# Altium schematic symbol library Linear Technology Power Management LDO Linear Regulators.SchLib: 2339 symbols (part 14 of 97) (continued)
## LT1521IST-3.3
designator U?
300 mA Low Dropout Regulator with Micropower Quiescent Current and Shutdown, 4.3 to 20 V Vin, 3.3 V Vout, 3-pin SOT223 (ST-3), -40 to 125 degC; Manufacturer: Linear Technology; PartNumber: LT1521IST-3.3; Discrete Pass Element: no; Dropout Voltage(V): 0.5; Iout(mA): 300; Isupply(mA): 0.012; Number of Outputs: 1; Output Voltage: 3.3 V; Shutdown Current(uA): 6; Vin Max(V): 20; Vin Min(V): 4.3; DatasheetVersion: Rev. B; PackageVersion: Jun-10; PackageReference: ST-3; PackageDescription: 3-Pin Plastic SOT-223, 3.505 x 6.505 mm Body, Pitch 2.3 mm; Supplier 1: Digi-Key; Supplier Part Number 1: LT1521IST-3.3-ND; Supplier 2: Newark; Supplier Part Number 2: 57M4776; RoHS: FALSE; Mounting Technology: Surface Mount; ComponentLink1Description: Manufacturer URL; ComponentLink1URL: http://www.linear.com/; ComponentLink2Description: Datasheet; ComponentLink2URL: http://cds.linear.com/docs/en/datasheet/1521335fb.pdf; ComponentLink3Description: Package Specification; ComponentLink3URL: http://cds.linear.com/docs/en/packaging/SOT_3_05-08-1630.pdf
footprint LT-ST-3-SOT-223_N (SOT223, 4-Leads, Body 6.505x3.505mm, Pitch 2.3mm, IPC Medium Density)
footprint LT-ST-3-SOT-223_L (SOT223, 4-Leads, Body 6.505x3.505mm, Pitch 2.3mm, IPC High Density)
footprint LT-ST-3-SOT-223_M (SOT223, 4-Leads, Body 6.505x3.505mm, Pitch 2.3mm, IPC Low Density)
pins: 1 IN (power) "Power is supplied to the device through the IN pin. A bypass capacitor is required on this pin if the device is more than six inches away from the main input filter capacitor. In general, the output impedance of a battery (See Datasheet)", 2 GND (power), 3 OUT (power) "The output supplies power to the load. A minimum output capacitor of 10uF is required to prevent oscillations. Larger output capacitors will be required for applications with large transient loads to limit peak voltage (See Datasheet)", 4 TAB (power)

## LT1521IST-3.3#PBF
designator U?
300 mA Low Dropout Regulator with Micropower Quiescent Current and Shutdown, 4.3 to 20 V Vin, 3.3 V Vout, 3-pin SOT223 (ST-3), -40 to 125 degC, Pb-Free; Manufacturer: Linear Technology; PartNumber: LT1521IST-3.3#PBF; Discrete Pass Element: no; Dropout Voltage(V): 0.5; Iout(mA): 300; Isupply(mA): 0.012; Number of Outputs: 1; Output Voltage: 3.3 V; Shutdown Current(uA): 6; Vin Max(V): 20; Vin Min(V): 4.3; DatasheetVersion: Rev. B; PackageVersion: Jun-10; PackageReference: ST-3; PackageDescription: 3-Pin Plastic SOT-223, 3.505 x 6.505 mm Body, Pitch 2.3 mm; Supplier 1: Digi-Key; Supplier Part Number 1: LT1521IST-3.3#PBF-ND; Supplier 2: Farnell; Supplier Part Number 2: 1663449; Supplier 3: Newark; Supplier Part Number 3: 57M4777; RoHS: TRUE; Mounting Technology: Surface Mount; ComponentLink1Description: Manufacturer URL; ComponentLink1URL: http://www.linear.com/; ComponentLink2Description: Datasheet; ComponentLink2URL: http://cds.linear.com/docs/en/datasheet/1521335fb.pdf; ComponentLink3Description: Package Specification; ComponentLink3URL: http://cds.linear.com/docs/en/packaging/SOT_3_05-08-1630.pdf
footprint LT-ST-3-SOT-223_N (SOT223, 4-Leads, Body 6.505x3.505mm, Pitch 2.3mm, IPC Medium Density)
footprint LT-ST-3-SOT-223_L (SOT223, 4-Leads, Body 6.505x3.505mm, Pitch 2.3mm, IPC High Density)
footprint LT-ST-3-SOT-223_M (SOT223, 4-Leads, Body 6.505x3.505mm, Pitch 2.3mm, IPC Low Density)
pins: 1 IN (power) "Power is supplied to the device through the IN pin. A bypass capacitor is required on this pin if the device is more than six inches away from the main input filter capacitor. In general, the output impedance of a battery (See Datasheet)", 2 GND (power), 3 OUT (power) "The output supplies power to the load. A minimum output capacitor of 10uF is required to prevent oscillations. Larger output capacitors will be required for applications with large transient loads to limit peak voltage (See Datasheet)", 4 TAB (power)

## LT1521IST-3.3#TR
designator U?
300 mA Low Dropout Regulator with Micropower Quiescent Current and Shutdown, 4.3 to 20 V Vin, 3.3 V Vout, 3-pin SOT223 (ST-3), -40 to 125 degC, Tape and Reel; Manufacturer: Linear Technology; PartNumber: LT1521IST-3.3#TR; Discrete Pass Element: no; Dropout Voltage(V): 0.5; Iout(mA): 300; Isupply(mA): 0.012; Number of Outputs: 1; Output Voltage: 3.3 V; Shutdown Current(uA): 6; Vin Max(V): 20; Vin Min(V): 4.3; DatasheetVersion: Rev. B; PackageVersion: Jun-10; PackageReference: ST-3; PackageDescription: 3-Pin Plastic SOT-223, 3.505 x 6.505 mm Body, Pitch 2.3 mm; Supplier 1: Digi-Key; Supplier Part Number 1: LT1521IST-3.3#TR-ND; Supplier 2: Newark; Supplier Part Number 2: 57M4778; Packing: Tape and Reel; RoHS: FALSE; Mounting Technology: Surface Mount; ComponentLink1Description: Manufacturer URL; ComponentLink1URL: http://www.linear.com/; ComponentLink2Description: Datasheet; ComponentLink2URL: http://cds.linear.com/docs/en/datasheet/1521335fb.pdf; ComponentLink3Description: Package Specification; ComponentLink3URL: http://cds.linear.com/docs/en/packaging/SOT_3_05-08-1630.pdf
footprint LT-ST-3-SOT-223_N (SOT223, 4-Leads, Body 6.505x3.505mm, Pitch 2.3mm, IPC Medium Density)
footprint LT-ST-3-SOT-223_L (SOT223, 4-Leads, Body 6.505x3.505mm, Pitch 2.3mm, IPC High Density)
footprint LT-ST-3-SOT-223_M (SOT223, 4-Leads, Body 6.505x3.505mm, Pitch 2.3mm, IPC Low Density)
pins: 1 IN (power) "Power is supplied to the device through the IN pin. A bypass capacitor is required on this pin if the device is more than six inches away from the main input filter capacitor. In general, the output impedance of a battery (See Datasheet)", 2 GND (power), 3 OUT (power) "The output supplies power to the load. A minimum output capacitor of 10uF is required to prevent oscillations. Larger output capacitors will be required for applications with large transient loads to limit peak voltage (See Datasheet)", 4 TAB (power)

## LT1521IST-3.3#TRPBF
designator U?
300 mA Low Dropout Regulator with Micropower Quiescent Current and Shutdown, 4.3 to 20 V Vin, 3.3 V Vout, 3-pin SOT223 (ST-3), -40 to 125 degC, Pb-Free, Tape and Reel; Manufacturer: Linear Technology; PartNumber: LT1521IST-3.3#TRPBF; Discrete Pass Element: no; Dropout Voltage(V): 0.5; Iout(mA): 300; Isupply(mA): 0.012; Number of Outputs: 1; Output Voltage: 3.3 V; Shutdown Current(uA): 6; Vin Max(V): 20; Vin Min(V): 4.3; DatasheetVersion: Rev. B; PackageVersion: Jun-10; PackageReference: ST-3; PackageDescription: 3-Pin Plastic SOT-223, 3.505 x 6.505 mm Body, Pitch 2.3 mm; Supplier 1: Digi-Key; Supplier Part Number 1: LT1521IST-3.3#TRPBF-ND; Supplier 2: Newark; Supplier Part Number 2: 57M4779; Packing: Tape and Reel; RoHS: TRUE; Mounting Technology: Surface Mount; ComponentLink1Description: Manufacturer URL; ComponentLink1URL: http://www.linear.com/; ComponentLink2Description: Datasheet; ComponentLink2URL: http://cds.linear.com/docs/en/datasheet/1521335fb.pdf; ComponentLink3Description: Package Specification; ComponentLink3URL: http://cds.linear.com/docs/en/packaging/SOT_3_05-08-1630.pdf
footprint LT-ST-3-SOT-223_N (SOT223, 4-Leads, Body 6.505x3.505mm, Pitch 2.3mm, IPC Medium Density)
footprint LT-ST-3-SOT-223_L (SOT223, 4-Leads, Body 6.505x3.505mm, Pitch 2.3mm, IPC High Density)
footprint LT-ST-3-SOT-223_M (SOT223, 4-Leads, Body 6.505x3.505mm, Pitch 2.3mm, IPC Low Density)
pins: 1 IN (power) "Power is supplied to the device through the IN pin. A bypass capacitor is required on this pin if the device is more than six inches away from the main input filter capacitor. In general, the output impedance of a battery (See Datasheet)", 2 GND (power), 3 OUT (power) "The output supplies power to the load. A minimum output capacitor of 10uF is required to prevent oscillations. Larger output capacitors will be required for applications with large transient loads to limit peak voltage (See Datasheet)", 4 TAB (power)

## LT1521IST-5
designator U?
300 mA Low Dropout Regulator with Micropower Quiescent Current and Shutdown, 4.3 to 20 V Vin, 5 V Vout, 3-pin SOT223 (ST-3), -40 to 125 degC; Manufacturer: Linear Technology; PartNumber: LT1521IST-5; Discrete Pass Element: no; Dropout Voltage(V): 0.5; Iout(mA): 300; Isupply(mA): 0.012; Number of Outputs: 1; Output Voltage: 5 V; Shutdown Current(uA): 6; Vin Max(V): 20; Vin Min(V): 4.3; DatasheetVersion: Rev. B; PackageVersion: Jun-10; PackageReference: ST-3; PackageDescription: 3-Pin Plastic SOT-223, 3.505 x 6.505 mm Body, Pitch 2.3 mm; Supplier 1: Digi-Key; Supplier Part Number 1: LT1521IST-5-ND; Supplier 2: Newark; Supplier Part Number 2: 57M4781; RoHS: FALSE; Mounting Technology: Surface Mount; ComponentLink1Description: Manufacturer URL; ComponentLink1URL: http://www.linear.com/; ComponentLink2Description: Datasheet; ComponentLink2URL: http://cds.linear.com/docs/en/datasheet/1521335fb.pdf; ComponentLink3Description: Package Specification; ComponentLink3URL: http://cds.linear.com/docs/en/packaging/SOT_3_05-08-1630.pdf
footprint LT-ST-3-SOT-223_N (SOT223, 4-Leads, Body 6.505x3.505mm, Pitch 2.3mm, IPC Medium Density)
footprint LT-ST-3-SOT-223_L (SOT223, 4-Leads, Body 6.505x3.505mm, Pitch 2.3mm, IPC High Density)
footprint LT-ST-3-SOT-223_M (SOT223, 4-Leads, Body 6.505x3.505mm, Pitch 2.3mm, IPC Low Density)
pins: 1 IN (power) "Power is supplied to the device through the IN pin. A bypass capacitor is required on this pin if the device is more than six inches away from the main input filter capacitor. In general, the output impedance of a battery (See Datasheet)", 2 GND (power), 3 OUT (power) "The output supplies power to the load. A minimum output capacitor of 10uF is required to prevent oscillations. Larger output capacitors will be required for applications with large transient loads to limit peak voltage (See Datasheet)", 4 TAB (power)

## LT1521IST-5#PBF
designator U?
300 mA Low Dropout Regulator with Micropower Quiescent Current and Shutdown, 4.3 to 20 V Vin, 5 V Vout, 3-pin SOT223 (ST-3), -40 to 125 degC, Pb-Free; Manufacturer: Linear Technology; PartNumber: LT1521IST-5#PBF; Discrete Pass Element: no; Dropout Voltage(V): 0.5; Iout(mA): 300; Isupply(mA): 0.012; Number of Outputs: 1; Output Voltage: 5 V; Shutdown Current(uA): 6; Vin Max(V): 20; Vin Min(V): 4.3; DatasheetVersion: Rev. B; PackageVersion: Jun-10; PackageReference: ST-3; PackageDescription: 3-Pin Plastic SOT-223, 3.505 x 6.505 mm Body, Pitch 2.3 mm; Supplier 1: Digi-Key; Supplier Part Number 1: LT1521IST-5#PBF-ND; Supplier 2: Farnell; Supplier Part Number 2: 1663450; Supplier 3: Newark; Supplier Part Number 3: 57M4782; RoHS: TRUE; Mounting Technology: Surface Mount; ComponentLink1Description: Manufacturer URL; ComponentLink1URL: http://www.linear.com/; ComponentLink2Description: Datasheet; ComponentLink2URL: http://cds.linear.com/docs/en/datasheet/1521335fb.pdf; ComponentLink3Description: Package Specification; ComponentLink3URL: http://cds.linear.com/docs/en/packaging/SOT_3_05-08-1630.pdf
footprint LT-ST-3-SOT-223_N (SOT223, 4-Leads, Body 6.505x3.505mm, Pitch 2.3mm, IPC Medium Density)
footprint LT-ST-3-SOT-223_L (SOT223, 4-Leads, Body 6.505x3.505mm, Pitch 2.3mm, IPC High Density)
footprint LT-ST-3-SOT-223_M (SOT223, 4-Leads, Body 6.505x3.505mm, Pitch 2.3mm, IPC Low Density)
pins: 1 IN (power) "Power is supplied to the device through the IN pin. A bypass capacitor is required on this pin if the device is more than six inches away from the main input filter capacitor. In general, the output impedance of a battery (See Datasheet)", 2 GND (power), 3 OUT (power) "The output supplies power to the load. A minimum output capacitor of 10uF is required to prevent oscillations. Larger output capacitors will be required for applications with large transient loads to limit peak voltage (See Datasheet)", 4 TAB (power)

## LT1521IST-5#TRPBF
designator U?
300 mA Low Dropout Regulator with Micropower Quiescent Current and Shutdown, 4.3 to 20 V Vin, 5 V Vout, 3-pin SOT223 (ST-3), -40 to 125 degC, Pb-Free, Tape and Reel; Manufacturer: Linear Technology; PartNumber: LT1521IST-5#TRPBF; Discrete Pass Element: no; Dropout Voltage(V): 0.5; Iout(mA): 300; Isupply(mA): 0.012; Number of Outputs: 1; Output Voltage: 5 V; Shutdown Current(uA): 6; Vin Max(V): 20; Vin Min(V): 4.3; DatasheetVersion: Rev. B; PackageVersion: Jun-10; PackageReference: ST-3; PackageDescription: 3-Pin Plastic SOT-223, 3.505 x 6.505 mm Body, Pitch 2.3 mm; Supplier 1: Digi-Key; Supplier Part Number 1: LT1521IST-5#TRPBF-ND; Supplier 2: Newark; Supplier Part Number 2: 75M4644; Packing: Tape and Reel; RoHS: TRUE; Mounting Technology: Surface Mount; ComponentLink1Description: Manufacturer URL; ComponentLink1URL: http://www.linear.com/; ComponentLink2Description: Datasheet; ComponentLink2URL: http://cds.linear.com/docs/en/datasheet/1521335fb.pdf; ComponentLink3Description: Package Specification; ComponentLink3URL: http://cds.linear.com/docs/en/packaging/SOT_3_05-08-1630.pdf
footprint LT-ST-3-SOT-223_N (SOT223, 4-Leads, Body 6.505x3.505mm, Pitch 2.3mm, IPC Medium Density)
footprint LT-ST-3-SOT-223_L (SOT223, 4-Leads, Body 6.505x3.505mm, Pitch 2.3mm, IPC High Density)
footprint LT-ST-3-SOT-223_M (SOT223, 4-Leads, Body 6.505x3.505mm, Pitch 2.3mm, IPC Low Density)
pins: 1 IN (power) "Power is supplied to the device through the IN pin. A bypass capacitor is required on this pin if the device is more than six inches away from the main input filter capacitor. In general, the output impedance of a battery (See Datasheet)", 2 GND (power), 3 OUT (power) "The output supplies power to the load. A minimum output capacitor of 10uF is required to prevent oscillations. Larger output capacitors will be required for applications with large transient loads to limit peak voltage (See Datasheet)", 4 TAB (power)

## LT1528CQ
designator U?
3 A Low Dropout Regulator for Microprocessor Applications, 3.9 to 15 V Vin, 3.3 Vout, 5-pin DPAK (Q-5), 0 to 125 degC; Manufacturer: Linear Technology; PartNumber: LT1528CQ; Discrete Pass Element: no; Dropout Voltage(V): 0.57; Iout(mA): 3000; Isupply(mA): 0.4; Number of Outputs: 1; Output Voltage: 3.3; PSRR(dB): 67; Shutdown Current(uA): 110; Vin Max(V): 15; Vin Min(V): 3.9; DatasheetVersion: Rev. B; PackageVersion: Rev. F, 09/2011; PackageReference: Q-5; PackageDescription: 5-Pin Plastic DD Pak, Body 10.2235 x 8.89 mm, Pitch 1.702 mm; Supplier 1: Digi-Key; Supplier Part Number 1: LT1528CQ-ND; Supplier 2: Newark; Supplier Part Number 2: 57M4797; RoHS: FALSE; Mounting Technology: Surface Mount; ComponentLink1Description: Manufacturer URL; ComponentLink1URL: http://www.linear.com/; ComponentLink2Description: Datasheet; ComponentLink2URL: http://cds.linear.com/docs/en/datasheet/1528fb.pdf; ComponentLink3Description: Package Specification; ComponentLink3URL: http://cds.linear.com/docs/en/packaging/Q%20DD5%2005-08-1461%20Rev%20F.pdf
footprint LT-Q-5_N (DPAK, 5-Leads, Body 10.22x8.89mm, Pitch 1.702mm, IPC Medium Density)
footprint LT-Q-5_L (DPAK, 5-Leads, Body 10.22x8.89mm, Pitch 1.702mm, IPC High Density)
footprint LT-Q-5_M (DPAK, 5-Leads, Body 10.22x8.89mm, Pitch 1.702mm, IPC Low Density)
pins: 1 OUT (power) "OUTPUT Pin.", 2 SENSE (in) "SENSE Pin.", 3 GND (power), 4 ~{SHDN} (in) "Shutdown Pin. This pin is used to put the device into shutdown. In shutdown the output of the device is turned off. This pin is active low. The device will be shut down if the S\H\D\N\ pin is actively pulled low. The (See Datasheet)", 5 VIN (power) "Input Pin. Power is supplied to the device through the VIN pin. The VIN pin should be bypassed to ground if the device is more than six inches away from the main input filter capacitor. In general, the output impedance of a (See Datasheet)", 6 TAB (power)

## LT1528CQ#PBF
designator U?
3 A Low Dropout Regulator for Microprocessor Applications, 3.9 to 15 V Vin, 3.3 Vout, 5-pin DPAK (Q-5), 0 to 125 degC, Pb-Free; Manufacturer: Linear Technology; PartNumber: LT1528CQ#PBF; Discrete Pass Element: no; Dropout Voltage(V): 0.57; Iout(mA): 3000; Isupply(mA): 0.4; Number of Outputs: 1; Output Voltage: 3.3; PSRR(dB): 67; Shutdown Current(uA): 110; Vin Max(V): 15; Vin Min(V): 3.9; DatasheetVersion: Rev. B; PackageVersion: Rev. F, 09/2011; PackageReference: Q-5; PackageDescription: 5-Pin Plastic DD Pak, Body 10.2235 x 8.89 mm, Pitch 1.702 mm; Supplier 1: Digi-Key; Supplier Part Number 1: LT1528CQ#PBF-ND; Supplier 2: Farnell; Supplier Part Number 2: 1615860; Supplier 3: Newark; Supplier Part Number 3: 57M4798; RoHS: TRUE; Mounting Technology: Surface Mount; ComponentLink1Description: Manufacturer URL; ComponentLink1URL: http://www.linear.com/; ComponentLink2Description: Datasheet; ComponentLink2URL: http://cds.linear.com/docs/en/datasheet/1528fb.pdf; ComponentLink3Description: Package Specification; ComponentLink3URL: http://cds.linear.com/docs/en/packaging/Q%20DD5%2005-08-1461%20Rev%20F.pdf
footprint LT-Q-5_N (DPAK, 5-Leads, Body 10.22x8.89mm, Pitch 1.702mm, IPC Medium Density)
footprint LT-Q-5_L (DPAK, 5-Leads, Body 10.22x8.89mm, Pitch 1.702mm, IPC High Density)
footprint LT-Q-5_M (DPAK, 5-Leads, Body 10.22x8.89mm, Pitch 1.702mm, IPC Low Density)
pins: 1 OUT (power) "OUTPUT Pin.", 2 SENSE (in) "SENSE Pin.", 3 GND (power), 4 ~{SHDN} (in) "Shutdown Pin. This pin is used to put the device into shutdown. In shutdown the output of the device is turned off. This pin is active low. The device will be shut down if the S\H\D\N\ pin is actively pulled low. The (See Datasheet)", 5 VIN (power) "Input Pin. Power is supplied to the device through the VIN pin. The VIN pin should be bypassed to ground if the device is more than six inches away from the main input filter capacitor. In general, the output impedance of a (See Datasheet)", 6 TAB (power)

## LT1528CQ#TR
designator U?
3 A Low Dropout Regulator for Microprocessor Applications, 3.9 to 15 V Vin, 3.3 Vout, 5-pin DPAK (Q-5), 0 to 125 degC, Tapa and Reel; Manufacturer: Linear Technology; PartNumber: LT1528CQ#TR; Discrete Pass Element: no; Dropout Voltage(V): 0.57; Iout(mA): 3000; Isupply(mA): 0.4; Number of Outputs: 1; Output Voltage: 3.3; PSRR(dB): 67; Shutdown Current(uA): 110; Vin Max(V): 15; Vin Min(V): 3.9; DatasheetVersion: Rev. B; PackageVersion: Rev. F, 09/2011; PackageReference: Q-5; PackageDescription: 5-Pin Plastic DD Pak, Body 10.2235 x 8.89 mm, Pitch 1.702 mm; Supplier 1: Digi-Key; Supplier Part Number 1: LT1528CQ#TR-ND; Packing: Tapa and Reel; RoHS: FALSE; Mounting Technology: Surface Mount; ComponentLink1Description: Manufacturer URL; ComponentLink1URL: http://www.linear.com/; ComponentLink2Description: Datasheet; ComponentLink2URL: http://cds.linear.com/docs/en/datasheet/1528fb.pdf; ComponentLink3Description: Package Specification; ComponentLink3URL: http://cds.linear.com/docs/en/packaging/Q%20DD5%2005-08-1461%20Rev%20F.pdf
footprint LT-Q-5_N (DPAK, 5-Leads, Body 10.22x8.89mm, Pitch 1.702mm, IPC Medium Density)
footprint LT-Q-5_L (DPAK, 5-Leads, Body 10.22x8.89mm, Pitch 1.702mm, IPC High Density)
footprint LT-Q-5_M (DPAK, 5-Leads, Body 10.22x8.89mm, Pitch 1.702mm, IPC Low Density)
pins: 1 OUT (power) "OUTPUT Pin.", 2 SENSE (in) "SENSE Pin.", 3 GND (power), 4 ~{SHDN} (in) "Shutdown Pin. This pin is used to put the device into shutdown. In shutdown the output of the device is turned off. This pin is active low. The device will be shut down if the S\H\D\N\ pin is actively pulled low. The (See Datasheet)", 5 VIN (power) "Input Pin. Power is supplied to the device through the VIN pin. The VIN pin should be bypassed to ground if the device is more than six inches away from the main input filter capacitor. In general, the output impedance of a (See Datasheet)", 6 TAB (power)

## LT1528CQ#TRPBF
designator U?
3 A Low Dropout Regulator for Microprocessor Applications, 3.9 to 15 V Vin, 3.3 Vout, 5-pin DPAK (Q-5), 0 to 125 degC, Pb-Free, Tape and Reel; Manufacturer: Linear Technology; PartNumber: LT1528CQ#TRPBF; Discrete Pass Element: no; Dropout Voltage(V): 0.57; Iout(mA): 3000; Isupply(mA): 0.4; Number of Outputs: 1; Output Voltage: 3.3; PSRR(dB): 67; Shutdown Current(uA): 110; Vin Max(V): 15; Vin Min(V): 3.9; DatasheetVersion: Rev. B; PackageVersion: Rev. F, 09/2011; PackageReference: Q-5; PackageDescription: 5-Pin Plastic DD Pak, Body 10.2235 x 8.89 mm, Pitch 1.702 mm; Supplier 1: Digi-Key; Supplier Part Number 1: LT1528CQ#TRPBF-ND; Supplier 2: Newark; Supplier Part Number 2: 57M4800; Packing: Tape and Reel; RoHS: TRUE; Mounting Technology: Surface Mount; ComponentLink1Description: Manufacturer URL; ComponentLink1URL: http://www.linear.com/; ComponentLink2Description: Datasheet; ComponentLink2URL: http://cds.linear.com/docs/en/datasheet/1528fb.pdf; ComponentLink3Description: Package Specification; ComponentLink3URL: http://cds.linear.com/docs/en/packaging/Q%20DD5%2005-08-1461%20Rev%20F.pdf
footprint LT-Q-5_N (DPAK, 5-Leads, Body 10.22x8.89mm, Pitch 1.702mm, IPC Medium Density)
footprint LT-Q-5_L (DPAK, 5-Leads, Body 10.22x8.89mm, Pitch 1.702mm, IPC High Density)
footprint LT-Q-5_M (DPAK, 5-Leads, Body 10.22x8.89mm, Pitch 1.702mm, IPC Low Density)
pins: 1 OUT (power) "OUTPUT Pin.", 2 SENSE (in) "SENSE Pin.", 3 GND (power), 4 ~{SHDN} (in) "Shutdown Pin. This pin is used to put the device into shutdown. In shutdown the output of the device is turned off. This pin is active low. The device will be shut down if the S\H\D\N\ pin is actively pulled low. The (See Datasheet)", 5 VIN (power) "Input Pin. Power is supplied to the device through the VIN pin. The VIN pin should be bypassed to ground if the device is more than six inches away from the main input filter capacitor. In general, the output impedance of a (See Datasheet)", 6 TAB (power)

## LT1528CT
designator U?
3 A Low Dropout Regulator for Microprocessor Applications, 3.9 to 15 V Vin, 3.3 Vout, 5-pin FM (T-5), 0 to 125 degC; Manufacturer: Linear Technology; PartNumber: LT1528CT; Discrete Pass Element: no; Dropout Voltage(V): 0.57; Iout(mA): 3000; Isupply(mA): 0.4; Number of Outputs: 1; Output Voltage: 3.3; PSRR(dB): 67; Shutdown Current(uA): 110; Vin Max(V): 15; Vin Min(V): 3.9; DatasheetVersion: Rev. B; PackageVersion: Aug-10; PackageReference: T-5; PackageDescription: 5-Pin Plastic TO-220 (Standard), Body 10.224 x 8.89 mm, Pitch 1.7 mm; Supplier 1: Digi-Key; Supplier Part Number 1: LT1528CT-ND; RoHS: FALSE; Mounting Technology: Through Hole; ComponentLink1Description: Manufacturer URL; ComponentLink1URL: http://www.linear.com/; ComponentLink2Description: Datasheet; ComponentLink2URL: http://cds.linear.com/docs/en/datasheet/1528fb.pdf; ComponentLink3Description: Package Specification; ComponentLink3URL: http://cds.linear.com/docs/en/packaging/TO-220_5_05-08-1421.pdf
footprint LT-T-5-S (FM, 5-Leads, Body 10.2235x4.3815mm, Pitch 1.7mm)
pins: 1 OUT (power) "OUTPUT Pin.", 2 SENSE (in), 3 GND (power), 4 ~{SHDN} (in) "Shutdown Pin.", 5 VIN (power) "Input Pin."

## LT1528CT#PBF
designator U?
3 A Low Dropout Regulator for Microprocessor Applications, 3.9 to 15 V Vin, 3.3 Vout, 5-pin FM (T-5), 0 to 125 degC, Pb-Free; Manufacturer: Linear Technology; PartNumber: LT1528CT#PBF; Discrete Pass Element: no; Dropout Voltage(V): 0.57; Iout(mA): 3000; Isupply(mA): 0.4; Number of Outputs: 1; Output Voltage: 3.3; PSRR(dB): 67; Shutdown Current(uA): 110; Vin Max(V): 15; Vin Min(V): 3.9; DatasheetVersion: Rev. B; PackageVersion: Aug-10; PackageReference: T-5; PackageDescription: 5-Pin Plastic TO-220 (Standard), Body 10.224 x 8.89 mm, Pitch 1.7 mm; Supplier 1: Digi-Key; Supplier Part Number 1: LT1528CT#PBF-ND; Supplier 2: Farnell; Supplier Part Number 2: 1273583; Supplier 3: Newark; Supplier Part Number 3: 57M4802; RoHS: TRUE; Mounting Technology: Through Hole; ComponentLink1Description: Manufacturer URL; ComponentLink1URL: http://www.linear.com/; ComponentLink2Description: Datasheet; ComponentLink2URL: http://cds.linear.com/docs/en/datasheet/1528fb.pdf; ComponentLink3Description: Package Specification; ComponentLink3URL: http://cds.linear.com/docs/en/packaging/TO-220_5_05-08-1421.pdf
footprint LT-T-5-S (FM, 5-Leads, Body 10.2235x4.3815mm, Pitch 1.7mm)
pins: 1 OUT (power) "OUTPUT Pin.", 2 SENSE (in), 3 GND (power), 4 ~{SHDN} (in) "Shutdown Pin.", 5 VIN (power) "Input Pin."

## LT1529CQ
designator U?
3 A Low Dropout Regulator with Micropower Quiescent Current and Shutdown, 3.8 to 15 V Vin, Adjustable Vout, 5-pin DPAK (Q-5), 0 to 125 degC; Manufacturer: Linear Technology; PartNumber: LT1529CQ; Discrete Pass Element: no; Dropout Voltage(V): 0.6; Iout(mA): 3000; Isupply(mA): 0.05; Number of Outputs: 1; Output Voltage: Adj; PSRR(dB): 62; Shutdown Current(uA): 15; Vin Min(V): 3.8; Vout Max(V): 14; DatasheetVersion: Rev. B; PackageVersion: Rev. F, 09/2011; PackageReference: Q-5; PackageDescription: 5-Pin Plastic DD Pak, Body 10.2235 x 8.89 mm, Pitch 1.702 mm; Supplier 1: Digi-Key; Supplier Part Number 1: LT1529CQ-ND; RoHS: FALSE; Vin Max(V): 15; Vout Min(V): 3.8; Mounting Technology: Surface Mount; ComponentLink1Description: Manufacturer URL; ComponentLink1URL: http://www.linear.com/; ComponentLink2Description: Datasheet; ComponentLink2URL: http://cds.linear.com/docs/en/datasheet/1529fb.pdf; ComponentLink3Description: Package Specification; ComponentLink3URL: http://cds.linear.com/docs/en/packaging/Q%20DD5%2005-08-1461%20Rev%20F.pdf
footprint LT-Q-5_N (DPAK, 5-Leads, Body 10.22x8.89mm, Pitch 1.702mm, IPC Medium Density)
footprint LT-Q-5_L (DPAK, 5-Leads, Body 10.22x8.89mm, Pitch 1.702mm, IPC High Density)
footprint LT-Q-5_M (DPAK, 5-Leads, Body 10.22x8.89mm, Pitch 1.702mm, IPC Low Density)
pins: 1 OUT (power) "OUTPUT Pin. The OUTPUT pin supplies power to the load. A minimum output capacitor of 22uF is required to prevent oscillations. Larger values will be required to optimize transient response for large load current deltas. See (See Datasheet)", 2 ADJ (in) "Adjust Pin. For the LT1529 (adjustable version) the ADJ pin is the input to the error amplifier. This pin is internally clamped to 6V and - 0.6V (one VBE). This pin has a bias current of 150nA which flows into the pin. See (See Datasheet)", 3 GND (power), 4 ~{SHDN} (in) "Shutdown Pin. This pin is used to put the device into shutdown. In shutdown the output of the device is turned off. This pin is active low. The device will be shut down if the S\H\D\N\ pin is actively pulled low. The (See Datasheet)", 5 VIN (power) "Input Pin. Power is supplied to the device through the VIN pin. The VIN pin should be bypassed to ground if the device is more than six inches away from the main input filter capacitor. In general, the output impedance of a (See Datasheet)", 6 TAB (power)

## LT1529CQ#PBF
designator U?
3 A Low Dropout Regulator with Micropower Quiescent Current and Shutdown, 3.8 to 15 V Vin, Adjustable Vout, 5-pin DPAK (Q-5), 0 to 125 degC, Pb-Free; Manufacturer: Linear Technology; PartNumber: LT1529CQ#PBF; Discrete Pass Element: no; Dropout Voltage(V): 0.6; Iout(mA): 3000; Isupply(mA): 0.05; Number of Outputs: 1; Output Voltage: Adj; PSRR(dB): 62; Shutdown Current(uA): 15; Vin Min(V): 3.8; Vout Max(V): 14; DatasheetVersion: Rev. B; PackageVersion: Rev. F, 09/2011; PackageReference: Q-5; PackageDescription: 5-Pin Plastic DD Pak, Body 10.2235 x 8.89 mm, Pitch 1.702 mm; Supplier 1: Digi-Key; Supplier Part Number 1: LT1529CQ#PBF-ND; Supplier 2: Farnell; Supplier Part Number 2: 1615859; Supplier 3: Newark; Supplier Part Number 3: 57M4812; RoHS: TRUE; Vin Max(V): 15; Vout Min(V): 3.8; Mounting Technology: Surface Mount; ComponentLink1Description: Manufacturer URL; ComponentLink1URL: http://www.linear.com/; ComponentLink2Description: Datasheet; ComponentLink2URL: http://cds.linear.com/docs/en/datasheet/1529fb.pdf; ComponentLink3Description: Package Specification; ComponentLink3URL: http://cds.linear.com/docs/en/packaging/Q%20DD5%2005-08-1461%20Rev%20F.pdf
footprint LT-Q-5_N (DPAK, 5-Leads, Body 10.22x8.89mm, Pitch 1.702mm, IPC Medium Density)
footprint LT-Q-5_L (DPAK, 5-Leads, Body 10.22x8.89mm, Pitch 1.702mm, IPC High Density)
footprint LT-Q-5_M (DPAK, 5-Leads, Body 10.22x8.89mm, Pitch 1.702mm, IPC Low Density)
pins: 1 OUT (power) "OUTPUT Pin. The OUTPUT pin supplies power to the load. A minimum output capacitor of 22uF is required to prevent oscillations. Larger values will be required to optimize transient response for large load current deltas. See (See Datasheet)", 2 ADJ (in) "Adjust Pin. For the LT1529 (adjustable version) the ADJ pin is the input to the error amplifier. This pin is internally clamped to 6V and - 0.6V (one VBE). This pin has a bias current of 150nA which flows into the pin. See (See Datasheet)", 3 GND (power), 4 ~{SHDN} (in) "Shutdown Pin. This pin is used to put the device into shutdown. In shutdown the output of the device is turned off. This pin is active low. The device will be shut down if the S\H\D\N\ pin is actively pulled low. The (See Datasheet)", 5 VIN (power) "Input Pin. Power is supplied to the device through the VIN pin. The VIN pin should be bypassed to ground if the device is more than six inches away from the main input filter capacitor. In general, the output impedance of a (See Datasheet)", 6 TAB (power)

## LT1529CQ#TR
designator U?
3 A Low Dropout Regulator with Micropower Quiescent Current and Shutdown, 3.8 to 15 V Vin, Adjustable Vout, 5-pin DPAK (Q-5), 0 to 125 degC, Tape and Reel; Manufacturer: Linear Technology; PartNumber: LT1529CQ#TR; Discrete Pass Element: no; Dropout Voltage(V): 0.6; Iout(mA): 3000; Isupply(mA): 0.05; Number of Outputs: 1; Output Voltage: Adj; PSRR(dB): 62; Shutdown Current(uA): 15; Vin Min(V): 3.8; Vout Max(V): 14; DatasheetVersion: Rev. B; PackageVersion: Rev. F, 09/2011; PackageReference: Q-5; PackageDescription: 5-Pin Plastic DD Pak, Body 10.2235 x 8.89 mm, Pitch 1.702 mm; Supplier 1: Digi-Key; Supplier Part Number 1: LT1529CQ#TR-ND; Packing: Tape and Reel; RoHS: FALSE; Vin Max(V): 15; Vout Min(V): 3.8; Mounting Technology: Surface Mount; ComponentLink1Description: Manufacturer URL; ComponentLink1URL: http://www.linear.com/; ComponentLink2Description: Datasheet; ComponentLink2URL: http://cds.linear.com/docs/en/datasheet/1529fb.pdf; ComponentLink3Description: Package Specification; ComponentLink3URL: http://cds.linear.com/docs/en/packaging/Q%20DD5%2005-08-1461%20Rev%20F.pdf
footprint LT-Q-5_N (DPAK, 5-Leads, Body 10.22x8.89mm, Pitch 1.702mm, IPC Medium Density)
footprint LT-Q-5_L (DPAK, 5-Leads, Body 10.22x8.89mm, Pitch 1.702mm, IPC High Density)
footprint LT-Q-5_M (DPAK, 5-Leads, Body 10.22x8.89mm, Pitch 1.702mm, IPC Low Density)
pins: 1 OUT (power) "OUTPUT Pin. The OUTPUT pin supplies power to the load. A minimum output capacitor of 22uF is required to prevent oscillations. Larger values will be required to optimize transient response for large load current deltas. See (See Datasheet)", 2 ADJ (in) "Adjust Pin. For the LT1529 (adjustable version) the ADJ pin is the input to the error amplifier. This pin is internally clamped to 6V and - 0.6V (one VBE). This pin has a bias current of 150nA which flows into the pin. See (See Datasheet)", 3 GND (power), 4 ~{SHDN} (in) "Shutdown Pin. This pin is used to put the device into shutdown. In shutdown the output of the device is turned off. This pin is active low. The device will be shut down if the S\H\D\N\ pin is actively pulled low. The (See Datasheet)", 5 VIN (power) "Input Pin. Power is supplied to the device through the VIN pin. The VIN pin should be bypassed to ground if the device is more than six inches away from the main input filter capacitor. In general, the output impedance of a (See Datasheet)", 6 TAB (power)

## LT1529CQ#TRPBF
designator U?
3 A Low Dropout Regulator with Micropower Quiescent Current and Shutdown, 3.8 to 15 V Vin, Adjustable Vout, 5-pin DPAK (Q-5), 0 to 125 degC, Pb-Free, Tape and Reel; Manufacturer: Linear Technology; PartNumber: LT1529CQ#TRPBF; Discrete Pass Element: no; Dropout Voltage(V): 0.6; Iout(mA): 3000; Isupply(mA): 0.05; Number of Outputs: 1; Output Voltage: Adj; PSRR(dB): 62; Shutdown Current(uA): 15; Vin Min(V): 3.8; Vout Max(V): 14; DatasheetVersion: Rev. B; PackageVersion: Rev. F, 09/2011; PackageReference: Q-5; PackageDescription: 5-Pin Plastic DD Pak, Body 10.2235 x 8.89 mm, Pitch 1.702 mm; Supplier 1: Digi-Key; Supplier Part Number 1: LT1529CQ#TRPBF-ND; Packing: Tape and Reel; RoHS: TRUE; Vin Max(V): 15; Vout Min(V): 3.8; Mounting Technology: Surface Mount; ComponentLink1Description: Manufacturer URL; ComponentLink1URL: http://www.linear.com/; ComponentLink2Description: Datasheet; ComponentLink2URL: http://cds.linear.com/docs/en/datasheet/1529fb.pdf; ComponentLink3Description: Package Specification; ComponentLink3URL: http://cds.linear.com/docs/en/packaging/Q%20DD5%2005-08-1461%20Rev%20F.pdf
footprint LT-Q-5_N (DPAK, 5-Leads, Body 10.22x8.89mm, Pitch 1.702mm, IPC Medium Density)
footprint LT-Q-5_L (DPAK, 5-Leads, Body 10.22x8.89mm, Pitch 1.702mm, IPC High Density)
footprint LT-Q-5_M (DPAK, 5-Leads, Body 10.22x8.89mm, Pitch 1.702mm, IPC Low Density)
pins: 1 OUT (power) "OUTPUT Pin. The OUTPUT pin supplies power to the load. A minimum output capacitor of 22uF is required to prevent oscillations. Larger values will be required to optimize transient response for large load current deltas. See (See Datasheet)", 2 ADJ (in) "Adjust Pin. For the LT1529 (adjustable version) the ADJ pin is the input to the error amplifier. This pin is internally clamped to 6V and - 0.6V (one VBE). This pin has a bias current of 150nA which flows into the pin. See (See Datasheet)", 3 GND (power), 4 ~{SHDN} (in) "Shutdown Pin. This pin is used to put the device into shutdown. In shutdown the output of the device is turned off. This pin is active low. The device will be shut down if the S\H\D\N\ pin is actively pulled low. The (See Datasheet)", 5 VIN (power) "Input Pin. Power is supplied to the device through the VIN pin. The VIN pin should be bypassed to ground if the device is more than six inches away from the main input filter capacitor. In general, the output impedance of a (See Datasheet)", 6 TAB (power)

## LT1529CQ-3.3
designator U?
3 A Low Dropout Regulator with Micropower Quiescent Current and Shutdown, 3.8 to 15 V Vin, 3.3 V Vout, 5-pin DPAK (Q-5), 0 to 125 degC; Manufacturer: Linear Technology; PartNumber: LT1529CQ-3.3; Discrete Pass Element: no; Dropout Voltage(V): 0.6; Iout(mA): 3000; Isupply(mA): 0.05; Number of Outputs: 1; Output Voltage: 3.3 V; PSRR(dB): 62; Shutdown Current(uA): 15; Vin Min(V): 3.8; DatasheetVersion: Rev. B; PackageVersion: Rev. F, 09/2011; PackageReference: Q-5; PackageDescription: 5-Pin Plastic DD Pak, Body 10.2235 x 8.89 mm, Pitch 1.702 mm; Supplier 1: Digi-Key; Supplier Part Number 1: LT1529CQ-3.3-ND; Supplier 2: Newark; Supplier Part Number 2: 57M4804; RoHS: FALSE; Vin Max(V): 15; Mounting Technology: Surface Mount; ComponentLink1Description: Manufacturer URL; ComponentLink1URL: http://www.linear.com/; ComponentLink2Description: Datasheet; ComponentLink2URL: http://cds.linear.com/docs/en/datasheet/1529fb.pdf; ComponentLink3Description: Package Specification; ComponentLink3URL: http://cds.linear.com/docs/en/packaging/Q%20DD5%2005-08-1461%20Rev%20F.pdf
footprint LT-Q-5_N (DPAK, 5-Leads, Body 10.22x8.89mm, Pitch 1.702mm, IPC Medium Density)
footprint LT-Q-5_L (DPAK, 5-Leads, Body 10.22x8.89mm, Pitch 1.702mm, IPC High Density)
footprint LT-Q-5_M (DPAK, 5-Leads, Body 10.22x8.89mm, Pitch 1.702mm, IPC Low Density)
pins: 1 OUT (power) "OUTPUT Pin.", 2 SENSE (in) "SENSE Pin.", 3 GND (power), 4 ~{SHDN} (in) "Shutdown Pin. This pin is used to put the device into shutdown. In shutdown the output of the device is turned off. This pin is active low. The device will be shut down if the S\H\D\N\ pin is actively pulled low. The (See Datasheet)", 5 VIN (power) "Input Pin. Power is supplied to the device through the VIN pin. The VIN pin should be bypassed to ground if the device is more than six inches away from the main input filter capacitor. In general, the output impedance of a (See Datasheet)", 6 TAB (power)

## LT1529CQ-3.3#PBF
designator U?
3 A Low Dropout Regulator with Micropower Quiescent Current and Shutdown, 3.8 to 15 V Vin, 3.3 V Vout, 5-pin DPAK (Q-5), 0 to 125 degC, Pb-Free; Manufacturer: Linear Technology; PartNumber: LT1529CQ-3.3#PBF; Discrete Pass Element: no; Dropout Voltage(V): 0.6; Iout(mA): 3000; Isupply(mA): 0.05; Number of Outputs: 1; Output Voltage: 3.3 V; PSRR(dB): 62; Shutdown Current(uA): 15; Vin Min(V): 3.8; DatasheetVersion: Rev. B; PackageVersion: Rev. F, 09/2011; PackageReference: Q-5; PackageDescription: 5-Pin Plastic DD Pak, Body 10.2235 x 8.89 mm, Pitch 1.702 mm; Supplier 1: Digi-Key; Supplier Part Number 1: LT1529CQ-3.3#PBF-ND; Supplier 2: Farnell; Supplier Part Number 2: 1615857; Supplier 3: Newark; Supplier Part Number 3: 57M4805; RoHS: TRUE; Vin Max(V): 15; Mounting Technology: Surface Mount; ComponentLink1Description: Manufacturer URL; ComponentLink1URL: http://www.linear.com/; ComponentLink2Description: Datasheet; ComponentLink2URL: http://cds.linear.com/docs/en/datasheet/1529fb.pdf; ComponentLink3Description: Package Specification; ComponentLink3URL: http://cds.linear.com/docs/en/packaging/Q%20DD5%2005-08-1461%20Rev%20F.pdf
footprint LT-Q-5_N (DPAK, 5-Leads, Body 10.22x8.89mm, Pitch 1.702mm, IPC Medium Density)
footprint LT-Q-5_L (DPAK, 5-Leads, Body 10.22x8.89mm, Pitch 1.702mm, IPC High Density)
footprint LT-Q-5_M (DPAK, 5-Leads, Body 10.22x8.89mm, Pitch 1.702mm, IPC Low Density)
pins: 1 OUT (power) "OUTPUT Pin.", 2 SENSE (in) "SENSE Pin.", 3 GND (power), 4 ~{SHDN} (in) "Shutdown Pin. This pin is used to put the device into shutdown. In shutdown the output of the device is turned off. This pin is active low. The device will be shut down if the S\H\D\N\ pin is actively pulled low. The (See Datasheet)", 5 VIN (power) "Input Pin. Power is supplied to the device through the VIN pin. The VIN pin should be bypassed to ground if the device is more than six inches away from the main input filter capacitor. In general, the output impedance of a (See Datasheet)", 6 TAB (power)

## LT1529CQ-3.3#TR
designator U?
3 A Low Dropout Regulator with Micropower Quiescent Current and Shutdown, 3.8 to 15 V Vin, 3.3 V Vout, 5-pin DPAK (Q-5), 0 to 125 degC, Tape and Reel; Manufacturer: Linear Technology; PartNumber: LT1529CQ-3.3#TR; Discrete Pass Element: no; Dropout Voltage(V): 0.6; Iout(mA): 3000; Isupply(mA): 0.05; Number of Outputs: 1; Output Voltage: 3.3 V; PSRR(dB): 62; Shutdown Current(uA): 15; Vin Min(V): 3.8; DatasheetVersion: Rev. B; PackageVersion: Rev. F, 09/2011; PackageReference: Q-5; PackageDescription: 5-Pin Plastic DD Pak, Body 10.2235 x 8.89 mm, Pitch 1.702 mm; Supplier 1: Digi-Key; Supplier Part Number 1: LT1529CQ-3.3#TR-ND; Packing: Tape and Reel; RoHS: FALSE; Vin Max(V): 15; Mounting Technology: Surface Mount; ComponentLink1Description: Manufacturer URL; ComponentLink1URL: http://www.linear.com/; ComponentLink2Description: Datasheet; ComponentLink2URL: http://cds.linear.com/docs/en/datasheet/1529fb.pdf; ComponentLink3Description: Package Specification; ComponentLink3URL: http://cds.linear.com/docs/en/packaging/Q%20DD5%2005-08-1461%20Rev%20F.pdf
footprint LT-Q-5_N (DPAK, 5-Leads, Body 10.22x8.89mm, Pitch 1.702mm, IPC Medium Density)
footprint LT-Q-5_L (DPAK, 5-Leads, Body 10.22x8.89mm, Pitch 1.702mm, IPC High Density)
footprint LT-Q-5_M (DPAK, 5-Leads, Body 10.22x8.89mm, Pitch 1.702mm, IPC Low Density)
pins: 1 OUT (power) "OUTPUT Pin.", 2 SENSE (in) "SENSE Pin.", 3 GND (power), 4 ~{SHDN} (in) "Shutdown Pin. This pin is used to put the device into shutdown. In shutdown the output of the device is turned off. This pin is active low. The device will be shut down if the S\H\D\N\ pin is actively pulled low. The (See Datasheet)", 5 VIN (power) "Input Pin. Power is supplied to the device through the VIN pin. The VIN pin should be bypassed to ground if the device is more than six inches away from the main input filter capacitor. In general, the output impedance of a (See Datasheet)", 6 TAB (power)

## LT1529CQ-3.3#TRPBF
designator U?
3 A Low Dropout Regulator with Micropower Quiescent Current and Shutdown, 3.8 to 15 V Vin, 3.3 V Vout, 5-pin DPAK (Q-5), 0 to 125 degC, Pb-Free, Tape and Reel; Manufacturer: Linear Technology; PartNumber: LT1529CQ-3.3#TRPBF; Discrete Pass Element: no; Dropout Voltage(V): 0.6; Iout(mA): 3000; Isupply(mA): 0.05; Number of Outputs: 1; Output Voltage: 3.3 V; PSRR(dB): 62; Shutdown Current(uA): 15; Vin Min(V): 3.8; DatasheetVersion: Rev. B; PackageVersion: Rev. F, 09/2011; PackageReference: Q-5; PackageDescription: 5-Pin Plastic DD Pak, Body 10.2235 x 8.89 mm, Pitch 1.702 mm; Supplier 1: Digi-Key; Supplier Part Number 1: LT1529CQ-3.3#TRPBF-ND; Packing: Tape and Reel; RoHS: TRUE; Vin Max(V): 15; Mounting Technology: Surface Mount; ComponentLink1Description: Manufacturer URL; ComponentLink1URL: http://www.linear.com/; ComponentLink2Description: Datasheet; ComponentLink2URL: http://cds.linear.com/docs/en/datasheet/1529fb.pdf; ComponentLink3Description: Package Specification; ComponentLink3URL: http://cds.linear.com/docs/en/packaging/Q%20DD5%2005-08-1461%20Rev%20F.pdf
footprint LT-Q-5_N (DPAK, 5-Leads, Body 10.22x8.89mm, Pitch 1.702mm, IPC Medium Density)
footprint LT-Q-5_L (DPAK, 5-Leads, Body 10.22x8.89mm, Pitch 1.702mm, IPC High Density)
footprint LT-Q-5_M (DPAK, 5-Leads, Body 10.22x8.89mm, Pitch 1.702mm, IPC Low Density)
pins: 1 OUT (power) "OUTPUT Pin.", 2 SENSE (in) "SENSE Pin.", 3 GND (power), 4 ~{SHDN} (in) "Shutdown Pin. This pin is used to put the device into shutdown. In shutdown the output of the device is turned off. This pin is active low. The device will be shut down if the S\H\D\N\ pin is actively pulled low. The (See Datasheet)", 5 VIN (power) "Input Pin. Power is supplied to the device through the VIN pin. The VIN pin should be bypassed to ground if the device is more than six inches away from the main input filter capacitor. In general, the output impedance of a (See Datasheet)", 6 TAB (power)

## LT1529CQ-5
designator U?
3 A Low Dropout Regulator with Micropower Quiescent Current and Shutdown, 3.8 to 15 V Vin, 5 V Vout, 5-pin DPAK (Q-5), 0 to 125 degC; Manufacturer: Linear Technology; PartNumber: LT1529CQ-5; Discrete Pass Element: no; Dropout Voltage(V): 0.6; Iout(mA): 3000; Isupply(mA): 0.05; Number of Outputs: 1; Output Voltage: 5 V; PSRR(dB): 62; Shutdown Current(uA): 15; Vin Min(V): 3.8; DatasheetVersion: Rev. B; PackageVersion: Rev. F, 09/2011; PackageReference: Q-5; PackageDescription: 5-Pin Plastic DD Pak, Body 10.2235 x 8.89 mm, Pitch 1.702 mm; Supplier 1: Digi-Key; Supplier Part Number 1: LT1529CQ-5-ND; Supplier 2: Newark; Supplier Part Number 2: 57M4808; RoHS: FALSE; Vin Max(V): 15; Mounting Technology: Surface Mount; ComponentLink1Description: Manufacturer URL; ComponentLink1URL: http://www.linear.com/; ComponentLink2Description: Datasheet; ComponentLink2URL: http://cds.linear.com/docs/en/datasheet/1529fb.pdf; ComponentLink3Description: Package Specification; ComponentLink3URL: http://cds.linear.com/docs/en/packaging/Q%20DD5%2005-08-1461%20Rev%20F.pdf
footprint LT-Q-5_N (DPAK, 5-Leads, Body 10.22x8.89mm, Pitch 1.702mm, IPC Medium Density)
footprint LT-Q-5_L (DPAK, 5-Leads, Body 10.22x8.89mm, Pitch 1.702mm, IPC High Density)
footprint LT-Q-5_M (DPAK, 5-Leads, Body 10.22x8.89mm, Pitch 1.702mm, IPC Low Density)
pins: 1 OUT (power) "OUTPUT Pin.", 2 SENSE (in) "SENSE Pin.", 3 GND (power), 4 ~{SHDN} (in) "Shutdown Pin. This pin is used to put the device into shutdown. In shutdown the output of the device is turned off. This pin is active low. The device will be shut down if the S\H\D\N\ pin is actively pulled low. The (See Datasheet)", 5 VIN (power) "Input Pin. Power is supplied to the device through the VIN pin. The VIN pin should be bypassed to ground if the device is more than six inches away from the main input filter capacitor. In general, the output impedance of a (See Datasheet)", 6 TAB (power)